# Altium footprint library Miscellaneous Connectors.PcbLib: 249 footprints (part 11 of 16)
Each footprint in its own frame and in the unit in brackets; x right, y up, seen from the top. Pads: shape width x height; smd on the part's side, far side on the other; paste and mask are expansions set on the pad; w line width, h text height; cw(c..) or ccw(c..) is an arc to the next point about the centre after c.
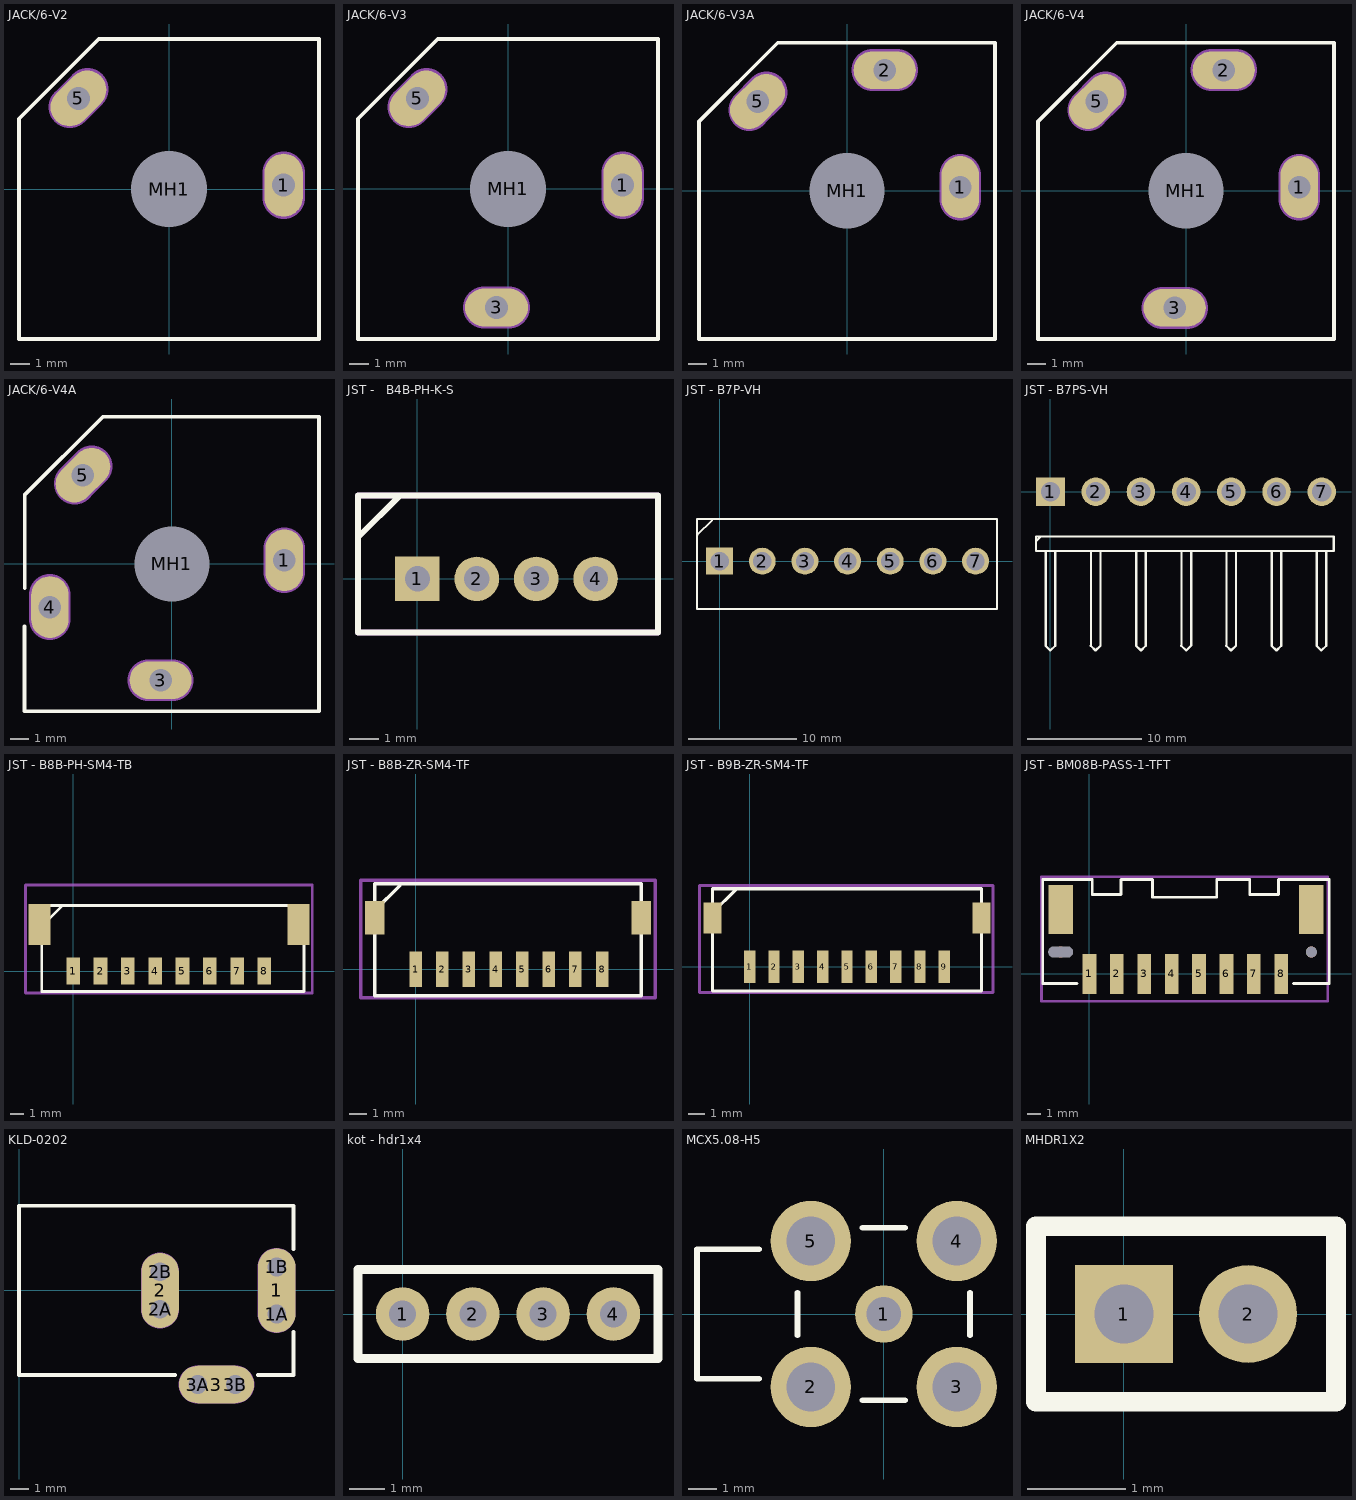
[diagram p10: the footprints below, top view; thin cyan lines are the x and y axes]

## JACK/6-V2 [mm] "Connector; Jack Socket, 1/4\" [6.5mm], Thru-Hole, 2 Position, Vertical, Body 15.7 x 15.7 x 31 mm (WxTxH)"
height 31.1
pads (3):
  oval 2x3.3 hole 1.2: 1(6,0.2)
  oval 2x3.3 hole 1.2 rot 135: 5(-4.738,4.738)
  round 3.7 hole 4: MH1(0,0)
Top Overlay:
  lines w0.2: -7.85,-7.85 -7.85,3.675 -3.675,7.85 7.85,7.85 7.85,-7.85 -7.85,-7.85
Mechanical 1:
  lines w1.2: -5.185,4.295 -4.266,5.214 ; 6,-0.45 6,0.85
  text "Mech 2 - Clearance, move to internal plane if present" at -7.9,8.16 h0.3
  text "Mech 1 - Slot cut-out" at -7.9,8.66 h0.3
  text "Assign keep-out area to slot" at -7.9,10.16 h0.3
  text "Slot 1.2x2.5mm, PTH" at -7.9,9.16 h0.3
  text "Alert PCB fab to slot details" at -7.9,9.66 h0.3
Mechanical 2:
  lines w2.216: -5.185,4.295 -4.266,5.214 ; 6,-0.45 6,0.85

## JACK/6-V3 [mm] "Connector; Jack Socket, 1/4\" [6.5mm], Thru-Hole, 3 Position, Vertical, Body 15.7 x 15.7 x 31 mm (WxTxH)"
height 31.1
pads (4):
  oval 2x3.3 hole 1.2: 1(6,0.2)
  oval 3.3x2 hole 1.2: 3(-0.6,-6.2)
  oval 2x3.3 hole 1.2 rot 135: 5(-4.738,4.738)
  round 3.7 hole 4: MH1(0,0)
Top Overlay:
  lines w0.2: -7.85,-7.85 7.85,-7.85 7.85,7.85 -3.675,7.85 -7.85,3.675 -7.85,-7.85
Mechanical 1:
  lines w1.2: -5.185,4.295 -4.266,5.214 ; -1.25,-6.2 0.05,-6.2 ; 6,-0.45 6,0.85
  text "Alert PCB fab to slot details" at -7.9,9.66 h0.3
  text "Slot 1.2x2.5mm, PTH" at -7.9,9.16 h0.3
  text "Assign keep-out area to slot" at -7.9,10.16 h0.3
  text "Mech 1 - Slot cut-out" at -7.9,8.66 h0.3
  text "Mech 2 - Clearance, move to internal plane if present" at -7.9,8.16 h0.3
Mechanical 2:
  lines w2.216: -5.185,4.295 -4.266,5.214 ; -1.25,-6.2 0.05,-6.2 ; 6,-0.45 6,0.85

## JACK/6-V3A [mm] "Connector; Jack Socket, 1/4\" [6.5mm], Thru-Hole, 3 Position, Vertical, Body 15.7 x 15.7 x 31 mm (WxTxH)"
height 31.1
pads (4):
  oval 2x3.3 hole 1.2: 1(6,0.2)
  oval 3.3x2 hole 1.2: 2(2,6.4)
  oval 2x3.3 hole 1.2 rot 135: 5(-4.738,4.738)
  round 3.7 hole 4: MH1(0,0)
Top Overlay:
  lines w0.2: -7.85,-7.85 -7.85,3.675 -3.675,7.85 7.85,7.85 7.85,-7.85 -7.85,-7.85
Mechanical 1:
  lines w1.2: -5.185,4.295 -4.266,5.214 ; 1.35,6.4 2.65,6.4 ; 6,-0.45 6,0.85
  text "Alert PCB fab to slot details" at -7.9,9.66 h0.3
  text "Slot 1.2x2.5mm, PTH" at -7.9,9.16 h0.3
  text "Assign keep-out area to slot" at -7.9,10.16 h0.3
  text "Mech 1 - Slot cut-out" at -7.9,8.66 h0.3
  text "Mech 2 - Clearance, move to internal plane if present" at -7.9,8.16 h0.3
Mechanical 2:
  lines w2.216: -5.185,4.295 -4.266,5.214 ; 1.35,6.4 2.65,6.4 ; 6,-0.45 6,0.85

## JACK/6-V4 [mm] "Connector; Jack Socket, 1/4\" [6.5mm], Thru-Hole, 4 Position, Vertical, Body 15.7 x 15.7 x 31 mm (WxTxH)"
height 31.1
pads (5):
  oval 2x3.3 hole 1.2: 1(6,0.2)
  oval 3.3x2 hole 1.2: 2(2,6.4) 3(-0.6,-6.2)
  oval 2x3.3 hole 1.2 rot 135: 5(-4.738,4.738)
  round 3.7 hole 4: MH1(0,0)
Top Overlay:
  lines w0.2: -7.85,-7.85 -7.85,3.675 -3.675,7.85 7.85,7.85 7.85,-7.85 -7.85,-7.85
Mechanical 1:
  lines w1.2: -5.185,4.295 -4.266,5.214 ; -1.25,-6.2 0.05,-6.2 ; 1.35,6.4 2.65,6.4 ; 6,-0.45 6,0.85
  text "Alert PCB fab to slot details" at -7.9,9.66 h0.3
  text "Slot 1.2x2.5mm, PTH" at -7.9,9.16 h0.3
  text "Assign keep-out area to slot" at -7.9,10.16 h0.3
  text "Mech 1 - Slot cut-out" at -7.9,8.66 h0.3
  text "Mech 2 - Clearance, move to internal plane if present" at -7.9,8.16 h0.3
Mechanical 2:
  lines w2.216: -5.185,4.295 -4.266,5.214 ; -1.25,-6.2 0.05,-6.2 ; 1.35,6.4 2.65,6.4 ; 6,-0.45 6,0.85

## JACK/6-V4A [mm] "Connector; Jack Socket, 1/4\" [6.5mm], Thru-Hole, 4 Position, Vertical, Body 15.7 x 15.7 x 31 mm (WxTxH)"
height 31.1
pads (5):
  oval 2x3.3 hole 1.2: 1(6,0.2) 4(-6.5,-2.3)
  oval 3.3x2 hole 1.2: 3(-0.6,-6.2)
  oval 2x3.3 hole 1.2 rot 135: 5(-4.738,4.738)
  round 3.7 hole 4: MH1(0,0)
Top Overlay:
  lines w0.2: -7.85,-3.32 -7.85,-7.85 7.85,-7.85 7.85,7.85 -3.675,7.85 -7.85,3.675 -7.85,-1.28
Mechanical 1:
  lines w1.2: -6.5,-2.95 -6.5,-1.65 ; -5.185,4.295 -4.266,5.214 ; -1.25,-6.2 0.05,-6.2 ; 6,-0.45 6,0.85
  text "Mech 2 - Clearance, move to internal plane if present" at -7.9,8.16 h0.3
  text "Mech 1 - Slot cut-out" at -7.9,8.66 h0.3
  text "Assign keep-out area to slot" at -7.9,10.16 h0.3
  text "Slot 1.2x2.5mm, PTH" at -7.9,9.16 h0.3
  text "Alert PCB fab to slot details" at -7.9,9.66 h0.3
Mechanical 2:
  lines w2.216: -6.5,-2.95 -6.5,-1.65 ; -5.185,4.295 -4.266,5.214 ; -1.25,-6.2 0.05,-6.2 ; 6,-0.45 6,0.85

## JST -   B4B-PH-K-S [mm] "fabricante JST; pitch 2mm"
pads (4):
  rect 1.5x1.5 hole 0.85: 1(0,0)
  round 1.5 hole 0.85: 2(2,0) 3(4,0) 4(6,0)
Top Overlay:
  lines w0.2: -1.967,1.433 -0.6,2.8 ; -2,-1.8 -2,2.8 8.1,2.8 8.1,-1.8 -2,-1.8
Mechanical 15:
  lines w0.2: -2,-1.8 8.1,-1.8 8.1,2.8 -2,2.8 -2,-1.8
3D body "conector jst B4B-PH-K-S.STEP": height 6, standoff -3.4, extent -1.9,-1.75 8,2.75

## JST - B7P-VH [mm] "fabricante JST; pitch 3.96mm"
pads (7):
  rect 2.5x2.5 hole 1.7: 1(0,0)
  round 2.5 hole 1.7: 2(3.96,0) 3(7.92,0) 4(11.88,0) 5(15.84,0) 6(19.8,0) 7(23.76,0)
Top Overlay:
  lines w0.2: -2.063,2.438 -0.697,3.805 ; -2.1,-4.425 25.75,-4.425 25.75,3.9 -2.1,3.9 -2.1,-4.425
3D body "conector jst B7P-VH.stp": height 10.4, standoff -2.9, extent -1.96,-4.475 25.76,3.965

## JST - B7PS-VH [mm] "fabricante JST; pitch 3.96mm"
pads (7):
  rect 2.5x2.5 hole 1.7: 1(0,0)
  round 2.5 hole 1.7: 2(3.96,0) 3(7.92,0) 4(11.88,0) 5(15.84,0) 6(19.8,0) 7(23.76,0)
Top Overlay:
  lines w0.2: -1.27,-4.343 -0.847,-3.92 ; -0.435,-13.488 -0.012,-13.912 0.412,-13.488 ; -0.423,-13.45 -0.423,-5.2 ; 0.423,-13.45 0.423,-5.2 ; 3.53,-13.488 3.953,-13.912 4.377,-13.488 ; 3.542,-13.45 3.542,-5.2 ; 4.388,-13.45 4.388,-5.2 ; 7.495,-13.488 7.918,-13.912 8.342,-13.488 ; 7.507,-13.45 7.507,-5.2 ; 8.353,-13.45 8.353,-5.2 ; 11.46,-13.488 11.883,-13.912 12.307,-13.488 ; 11.472,-13.45 11.472,-5.2 ; 12.318,-13.45 12.318,-5.2 ; 15.4,-13.488 15.823,-13.912 16.247,-13.488 ; 15.412,-13.45 15.412,-5.2 ; 16.258,-13.45 16.258,-5.2 ; 19.365,-13.488 19.788,-13.912 20.212,-13.488 ; 19.377,-13.45 19.377,-5.2 ; 20.223,-13.45 20.223,-5.2 ; 23.305,-13.488 23.728,-13.912 24.152,-13.488 ; 23.317,-13.45 23.317,-5.2 ; 24.163,-13.45 24.163,-5.2 ; -1.27,-5.19 -1.27,-3.92 24.825,-3.92 24.825,-5.19 -1.27,-5.19
3D body "conector jst B7PS-VH.stp": height 8.44, standoff -3, extent -2.02,-15.07 25.7,0.62

## JST - B8B-PH-SM4-TB [mm] "fabricante JST; pitch 2mm"
pads (10):
  rect 1x2 smd: 1(0,0) 2(2,0) 3(4,0) 4(6,0) 5(8,0) 6(10,0) 7(12,0) 8(14,0)
  rect 1.6x3 smd: ""(-2.475,3.4) ""(16.5,3.4)
Top Overlay:
  lines w0.2: -2.263,3.338 -0.897,4.705 ; -2.3,-1.5 -2.3,4.8 16.9,4.8 16.9,-1.5 -2.3,-1.5
Mechanical 15:
  lines w0.2: -3.5,-1.6 17.5,-1.6 17.5,6.3 -3.5,6.3 -3.5,-1.6
3D body "conector - jst B8B-PH-SM4-TB.STEP": height 6.6, standoff 0, extent -2.975,-0.9 16.975,6.1

## JST - B8B-ZR-SM4-TF [mm] "fabricante JST; pitch 3.96mm"
pads (10):
  rect 0.7x2 smd: 1(0,0) 2(1.5,0) 3(3,0) 4(4.5,0) 5(6,0) 6(7.5,0) 7(9,0) 8(10.5,0)
  rect 1.1x1.9 smd: ""(-2.3,2.9) ""(12.7,2.9)
Top Overlay:
  lines w0.2: -2.263,3.338 -0.897,4.705 ; -2.3,-1.5 12.7,-1.5 12.7,4.8 -2.3,4.8 -2.3,-1.5
Mechanical 15:
  lines w0.2: -3.1,-1.6 -3.1,5 13.5,5 13.5,-1.6 -3.1,-1.6
3D body "conector jst B8B-ZR-SM4-TF.STEP": height 5, standoff 0, extent -2.3,-0.6 12.7,4.6

## JST - B9B-ZR-SM4-TF [mm] "fabricante JST; pitch 3.96mm"
pads (11):
  rect 0.7x2 smd: 1(0,0) 2(1.5,0) 3(3,0) 4(4.5,0) 5(6,0) 6(7.5,0) 7(9,0) 8(10.5,0) 9(12,0)
  rect 1.1x1.9 smd: ""(-2.3,3) ""(14.3,3)
Top Overlay:
  lines w0.2: -2.263,3.338 -0.897,4.705 ; -2.3,-1.5 -2.3,4.8 14.3,4.8 14.3,-1.5 -2.3,-1.5
Mechanical 15:
  lines w0.2: -3.1,-1.6 15,-1.6 15,5 -3.1,5 -3.1,-1.6
3D body "conector jst B9B-ZR-SM4-TF.STEP": height 5, standoff 0, extent -2.2,-0.5 14.3,4.7

## JST - BM08B-PASS-1-TFT [mm] "fabricante JST; pitch 2mm"
pads (12):
  rect 1x2.9 smd: 1(0,0) 2(2,0) 3(4,0) 4(6,0) 5(8,0) 6(10,0) 7(12,0) 8(14,0)
  round 0.8 hole 0.8 slot 1.8 at 0 deg paste+0 mask+0.102: ""(-2.1,1.6)
  rect 1.8x3.6 smd: ""(-2.1,4.7) ""(16.2,4.7)
  round 0.8 hole 0.8 paste+0 mask+0.102: ""(16.2,1.6)
Top Overlay:
  lines w0.2: -0.9,-0.7 -3.4,-0.7 -3.4,6.9 0.2,6.9 0.2,5.8 2.3,5.8 2.3,6.9 4.6,6.9 4.6,5.6 9.3,5.6 9.3,6.9 11.7,6.9 11.7,5.8 13.8,5.8 13.8,6.9 17.5,6.9 17.5,-0.7 14.9,-0.7
Mechanical 15:
  lines w0.2: -3.5,-2 -3.5,7.1 17.4,7.1 17.4,-2 -3.5,-2
3D body "conector JST - BM08B-PASS-1-TF.STEP": height 9, standoff -0.4, extent -3,-0.6 17,6.5

## KLD-0202 [mm] "DC Power Jack, 2.5mm, KLD Series, PCB Mount"
pads (9):
  oval 2x4.5 all layers, no hole: 1(13.7,0)
  round 1.5 hole 1: 1A(13.7,-1.25) 1B(13.7,1.25) 2A(7.5,-1) 2B(7.5,1) 3A(9.5,-5) 3B(11.5,-5)
  oval 2x4 all layers, no hole: 2(7.5,0)
  oval 4x2 all layers, no hole: 3(10.5,-5)
Top Overlay:
  lines w0.2: 8.3,-4.5 0,-4.5 0,4.5 14.6,4.5 14.6,2.2 ; 12.7,-4.5 14.6,-4.5 14.6,-2.2
Mechanical 1:
  lines w1: 7.5,-1 7.5,1 ; 9.5,-5 11.5,-5 ; 13.7,-1.25 13.7,1.25
  text "Alert PCB fab to slot details" at 0.286,6.066 h0.3
  text "Assign keep-out area to slot" at 0.286,6.566 h0.3
  text "Mech 1 - Slot cut-out" at 0.286,5.566 h0.3
  text "Mech 2 - Clearance, move to internal plane if present" at 0.286,5.066 h0.3
Mechanical 2:
  lines w2.016: 7.5,-1 7.5,1 ; 9.5,-5 11.5,-5 ; 13.7,-1.25 13.7,1.25

## kot - hdr1x4 [mil]
pads (4):
  round 60 hole 30: 1(0,0) 2(78.74,0) 3(157.48,0) 4(236.22,0)
Top Overlay:
  lines w10: -50,-50 286.22,-50 286.22,50 -50,50 -50,-50

## MCX5.08-H5 [mm] "Connector; RF Coaxial, MCX, Thru-Hole; 5 Position; Right-Angle"
height 5.85
pads (5):
  round 2 hole 1.2: 1(0,0)
  round 2.8 hole 1.7: 2(-2.54,-2.54) 3(2.54,-2.54) 4(2.54,2.54) 5(-2.54,2.54)
Top Overlay:
  lines w0.2: -4.34,-2.25 -6.5,-2.25 -6.5,2.25 -4.34,2.25 ; -3,-0.74 -3,0.74 ; -0.74,-3 0.74,-3 ; -0.74,3 0.74,3 ; 3,-0.74 3,0.74

## MHDR1X2 [mm] "Connector; Header; 2 Position"
pads (2):
  rect 1x1 hole 0.6: 1(0,0)
  round 1 hole 0.6: 2(1.27,0)
Top Overlay:
  lines w0.2: -0.9,-0.9 -0.9,0.9 2.17,0.9 2.17,-0.9 -0.9,-0.9